# Altium footprint library Circuitos Integrados.PcbLib: 81 footprints (part 3 of 6)
Each footprint in its own frame and in the unit in brackets; x right, y up, seen from the top. Pads: shape width x height; smd on the part's side, far side on the other; paste and mask are expansions set on the pad; w line width, h text height; cw(c..) or ccw(c..) is an arc to the next point about the centre after c.
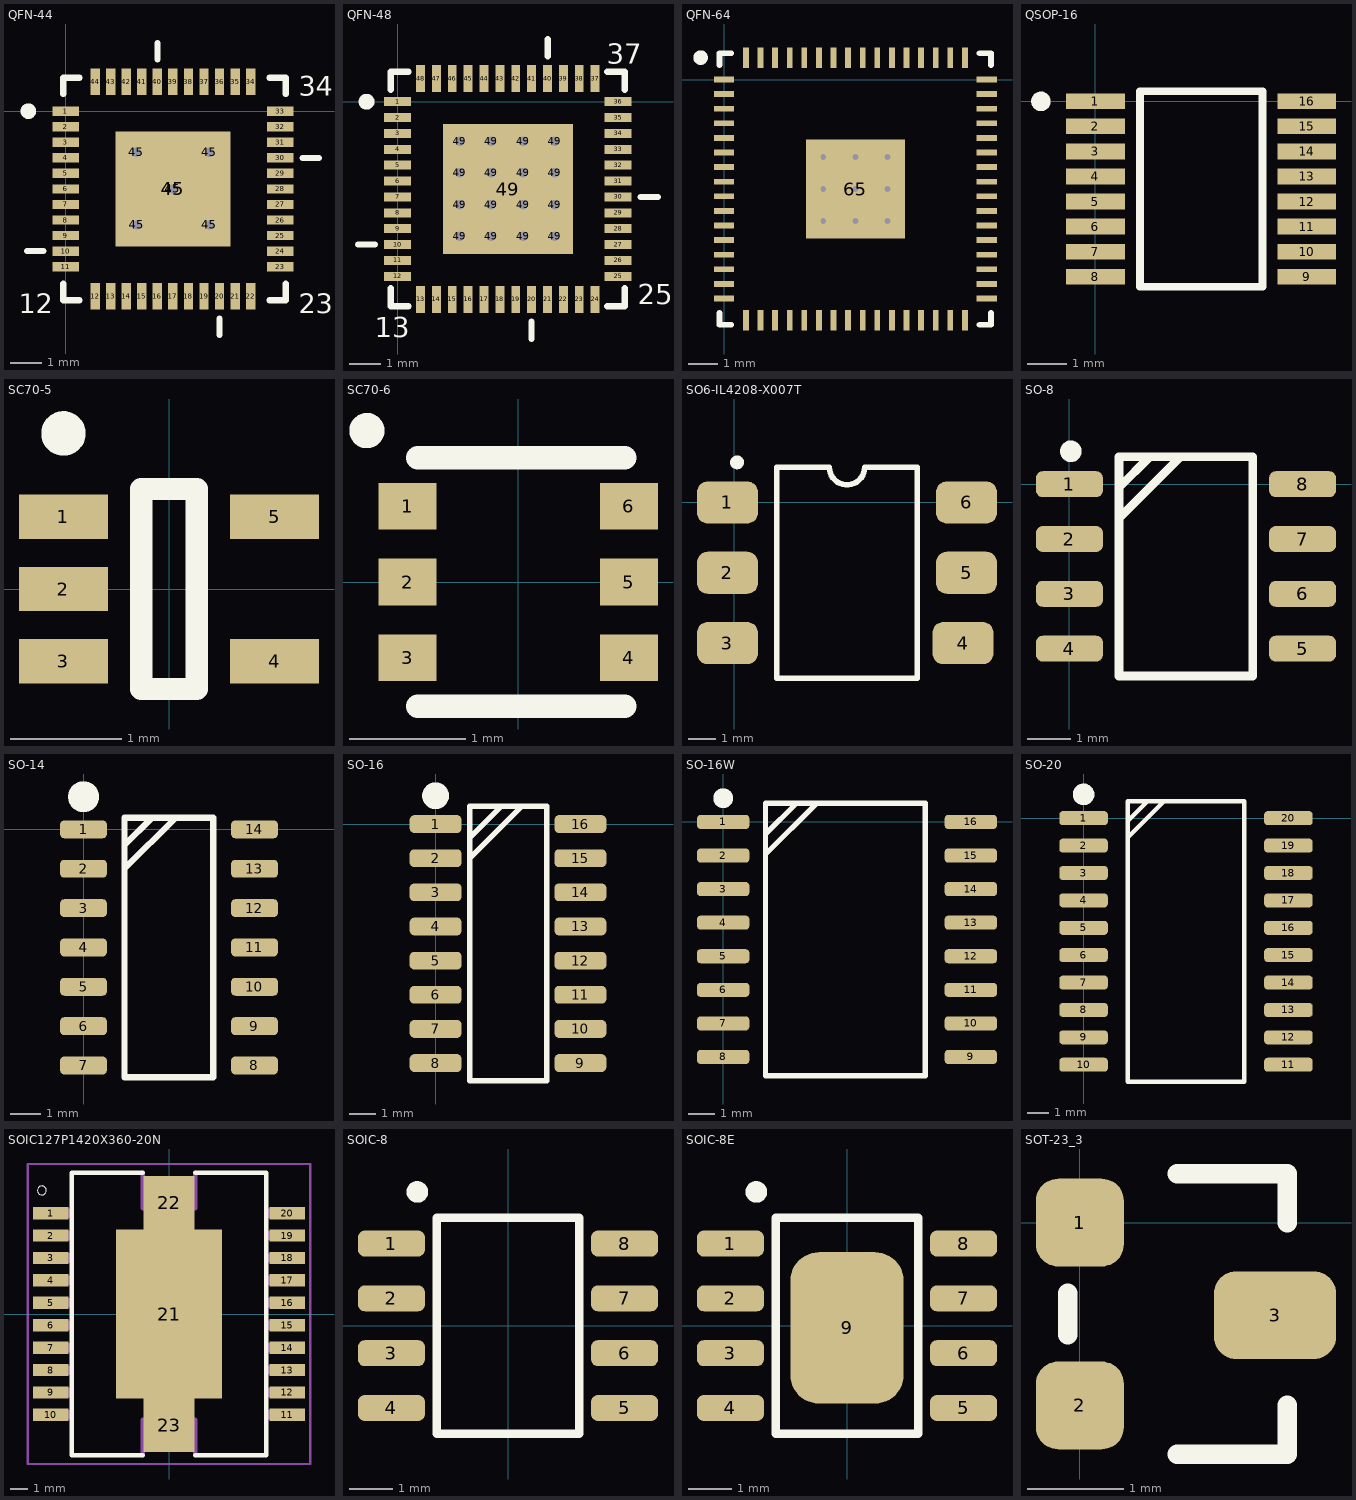
[diagram p2: the footprints below, top view; thin cyan lines are the x and y axes]

## QFN-44 [mm] "QFN, 44-Leads, Body 7,1x7,1mm (max), Pitch 0,50mm, IPC Low Density"
height 1
pads (50):
  rect 0.85x0.3 smd: 1(0,0) 2(0,-0.5) 3(0,-1) 4(0,-1.5) 5(0,-2) 6(0,-2.5) 7(0,-3) 8(0,-3.5) 9(0,-4) 10(0,-4.5) 11(0,-5) 23(6.9,-5) 24(6.9,-4.5) 25(6.9,-4) 26(6.9,-3.5) 27(6.9,-3) 28(6.9,-2.5) 29(6.9,-2) 30(6.9,-1.5) 31(6.9,-1) 32(6.9,-0.5) 33(6.9,0)
  rect 0.3x0.85 smd: 12(0.948,-5.952) 13(1.448,-5.952) 14(1.948,-5.952) 15(2.448,-5.952) 16(2.948,-5.952) 17(3.448,-5.952) 18(3.948,-5.952) 19(4.448,-5.952) 20(4.948,-5.952) 21(5.448,-5.952) 22(5.948,-5.952) 34(5.948,0.948) 35(5.448,0.948) 36(4.948,0.948) 37(4.448,0.948) 38(3.948,0.948) 39(3.448,0.948) 40(2.948,0.948) 41(2.448,0.948) 42(1.948,0.948) 43(1.448,0.948) 44(0.948,0.948)
  round 0.6 hole 0.3 mask+0.07: 45(2.273,-1.325) 45(2.286,-3.658) 45(3.448,-2.5) 45(4.623,-3.658) 45(4.623,-1.321)
  rect 3.7x3.7 smd paste-200 mask+0.07: 45(3.448,-2.5)
Top Overlay:
  circle w0.25: c-1.2,0 r0.125
  lines w0.2: -1.245,-4.496 -0.711,-4.496 ; 2.952,1.659 2.952,2.192 ; 4.943,-7.197 4.943,-6.664 ; 7.611,-1.504 8.145,-1.504
  lines w0.203: -0.077,-5.552 -0.077,-6.075 0.446,-6.075 ; -0.077,0.552 -0.077,1.075 0.446,1.075 ; 6.55,-6.075 7.074,-6.075 7.074,-5.552 ; 6.55,1.075 7.074,1.075 7.074,0.552
  text "34" at 7.5,0.5 h0.64
  text "23" at 7.5,-6.5 h0.64
  text "12" at -1.5,-6.5 h0.64
Top Paste:
  rectangle: 3.555,-3.674 4.555,-2.674
  region: 2.305,-2.674 2.305,-3.674 3.305,-3.674 3.305,-2.674
  rectangle: 3.555,-2.424 4.555,-1.424
  rectangle: 2.305,-2.424 3.305,-1.424
3D body "User Library-smd_qfn-44-2.STEP": height 0.9, standoff 0, extent -0.053,-6.003 6.949,0.999

## QFN-48 [mm] "QFN, 48-Leads, Body 7,2x7,2mm (max), Pitch 0,50mm, IPC Medium Density"
height 1
pads (65):
  rect 0.85x0.28 smd paste-0.02 mask+0.076: 1(0,0) 2(0,-0.5) 3(0,-1) 4(0,-1.5) 5(0,-2) 6(0,-2.5) 7(0,-3) 8(0,-3.5) 9(0,-4) 10(0,-4.5) 11(0,-5) 12(0,-5.5) 25(6.95,-5.5) 26(6.95,-5) 27(6.95,-4.5) 28(6.95,-4) 29(6.95,-3.5) 30(6.95,-3) 31(6.95,-2.5) 32(6.95,-2) 33(6.95,-1.5) 34(6.95,-1) 35(6.95,-0.5) 36(6.95,0)
  rect 0.28x0.85 smd paste-0.02 mask+0.076: 13(0.725,-6.225) 14(1.225,-6.225) 15(1.725,-6.225) 16(2.225,-6.225) 17(2.725,-6.225) 18(3.225,-6.225) 19(3.725,-6.225) 20(4.225,-6.225) 21(4.725,-6.225) 22(5.225,-6.225) 23(5.725,-6.225) 24(6.225,-6.225) 37(6.225,0.725) 38(5.725,0.725) 39(5.225,0.725) 40(4.725,0.725) 41(4.225,0.725) 42(3.725,0.725) 43(3.225,0.725) 44(2.725,0.725) 45(2.225,0.725) 46(1.725,0.725) 47(1.225,0.725) 48(0.725,0.725)
  round 0.5 hole 0.3: 49(1.956,-4.245) 49(1.956,-3.245) 49(1.956,-2.245) 49(1.956,-1.245) 49(2.956,-4.245) 49(2.956,-3.245) 49(2.956,-2.245) 49(2.956,-1.245) 49(3.956,-4.245) 49(3.956,-3.245) 49(3.956,-2.245) 49(3.956,-1.245) 49(4.956,-4.245) 49(4.956,-3.245) 49(4.956,-2.245) 49(4.956,-1.245)
  rect 4.1x4.1 smd paste-200 mask+0.076: 49(3.475,-2.75)
Top Overlay:
  circle w0.25: c-0.975,0 r0.125
  lines w0.2: -1.245,-4.496 -0.711,-4.496 ; 4.221,-7.47 4.221,-6.936 ; 4.729,1.436 4.729,1.97 ; 7.661,-3.004 8.195,-3.004
  lines w0.203: -0.213,-5.881 -0.213,-6.44 0.346,-6.44 ; -0.213,0.381 -0.213,0.94 0.346,0.94 ; 6.604,-6.44 7.163,-6.44 7.163,-5.881 ; 6.604,0.94 7.163,0.94 7.163,0.381
  text "13" at -0.711,-7.417 h0.64
  text "25" at 7.569,-6.375 h0.64
  text "37" at 6.596,1.203 h0.64
Top Paste:
  rectangle: 1.441,-4.775 2.591,-3.625
  rectangle: 2.889,-4.775 4.039,-3.625
  rectangle: 4.336,-4.775 5.486,-3.625
  rectangle: 1.441,-3.327 2.591,-2.177
  rectangle: 2.889,-3.327 4.039,-2.177
  rectangle: 4.336,-3.327 5.486,-2.177
  rectangle: 4.336,-1.88 5.486,-0.73
  rectangle: 2.889,-1.88 4.039,-0.73
  rectangle: 1.441,-1.88 2.591,-0.73
3D body "User Library-QFN48_7x7.STEP": height 0.78, standoff -0.02, extent -0.03,-6.248 6.99,0.772

## QFN-64 [mm]
height 1
pads (65):
  rect 0.7x0.2 smd: 1(0,0) 2(0,-0.5) 3(0,-1) 4(0,-1.5) 5(0,-2) 6(0,-2.5) 7(0,-3) 8(0,-3.5) 9(0,-4) 10(0,-4.5) 11(0,-5) 12(0,-5.5) 13(0,-6) 14(0,-6.5) 15(0,-7) 16(0,-7.5) 33(9,-7.5) 34(9,-7) 35(9,-6.5) 36(9,-6) 37(9,-5.5) 38(9,-5) 39(9,-4.5) 40(9,-4) 41(9,-3.5) 42(9,-3) 43(9,-2.5) 44(9,-2) 45(9,-1.5) 46(9,-1) 47(9,-0.5) 48(9,0)
  rect 0.2x0.7 smd: 17(0.75,-8.25) 18(1.25,-8.25) 19(1.75,-8.25) 20(2.25,-8.25) 21(2.75,-8.25) 22(3.25,-8.25) 23(3.75,-8.25) 24(4.25,-8.25) 25(4.75,-8.25) 26(5.25,-8.25) 27(5.75,-8.25) 28(6.25,-8.25) 29(6.75,-8.25) 30(7.25,-8.25) 31(7.75,-8.25) 32(8.25,-8.25) 49(8.25,0.75) 50(7.75,0.75) 51(7.25,0.75) 52(6.75,0.75) 53(6.25,0.75) 54(5.75,0.75) 55(5.25,0.75) 56(4.75,0.75) 57(4.25,0.75) 58(3.75,0.75) 59(3.25,0.75) 60(2.75,0.75) 61(2.25,0.75) 62(1.75,0.75) 63(1.25,0.75) 64(0.75,0.75)
  rect 3.4x3.4 smd: 65(4.5,-3.75)
via 5.6,-4.85 diameter 0.5 hole 0.2
via 4.5,-4.85 diameter 0.5 hole 0.2
via 3.4,-4.85 diameter 0.5 hole 0.2
via 5.6,-3.75 diameter 0.5 hole 0.2
via 4.5,-3.75 diameter 0.5 hole 0.2
via 3.4,-3.75 diameter 0.5 hole 0.2
via 5.6,-2.65 diameter 0.5 hole 0.2
via 4.5,-2.65 diameter 0.5 hole 0.2
via 3.4,-2.65 diameter 0.5 hole 0.2
Top Overlay:
  circle w0.25: c-0.8,0.75 r0.125
  lines w0.2: -0.15,-8 -0.15,-8.4 0.25,-8.4 ; -0.15,0.5 -0.15,0.9 0.25,0.9 ; 8.75,-8.4 9.15,-8.4 9.15,-8 ; 8.75,0.9 9.15,0.9 9.15,0.5
3D body "User Library-QFN64-2.STEP": height 0.9, standoff 0, extent -0.02,-8.27 9.02,0.77

## QSOP-16 [mm] "QSOP, 16-Leads, Body 5.0x4.0mm (max), Pitch 0.64mm, IPC Medium Density"
height 1.75
pads (16):
  rect 1.5x0.4 smd: 1(0,0) 2(0,-0.64) 3(0,-1.28) 4(0,-1.92) 5(0,-2.56) 6(0,-3.2) 7(0,-3.84) 8(0,-4.48) 9(5.4,-4.48) 10(5.4,-3.84) 11(5.4,-3.2) 12(5.4,-2.56) 13(5.4,-1.92) 14(5.4,-1.28) 15(5.4,-0.64) 16(5.4,0)
Top Overlay:
  circle w0.25: c-1.395,0 r0.125
  lines w0.2: 1.143,-4.74 4.267,-4.74 4.267,0.26 1.143,0.26 1.143,-4.74
3D body "User Library-MAX_QSOP16.STEP": height 1.81, standoff 0.04, extent -0.292,-4.725 5.728,0.255

## SC70-5 [mm] "SC-70, 5-Leads"
height 1.1
pads (5):
  rect 0.8x0.4 smd: 1(-0.95,0.65) 2(-0.95,0) 3(-0.95,-0.65) 4(0.95,-0.65) 5(0.95,0.65)
Top Overlay:
  circle w0.2: c-0.95,1.4 r0.1
  lines w0.2: -0.25,-0.9 0.25,-0.9 0.25,0.9 -0.25,0.9 -0.25,-0.9
3D body "sot353.STEP": height 1, standoff 0, extent -1.15,-1.05 1.15,1.05

## SC70-6 [mm] "SC70-6, 6 pins, Height = 1mm"
height 1
pads (6):
  rect 0.5x0.4 smd: 1(-0.95,0.65) 2(-0.95,0) 3(-0.95,-0.65) 4(0.95,-0.65) 5(0.95,0) 6(0.95,0.65)
Top Overlay:
  circle w0.15: c-1.3,1.3 r0.076
  lines w0.2: -0.864,-1.067 0.914,-1.067 ; -0.864,1.067 0.914,1.067
3D body "SC70-6.STEP": height 0.92, standoff -0.03, extent -1.05,-1 1.05,1

## SO6-IL4208-X007T [mm]
height 1.75
pads (6):
  rrect50% 2.2x1.52 smd: 1(-0.254,0) 2(-0.254,-2.54) 3(-0.254,-5.08) 4(8.254,-5.08) 5(8.382,-2.54) 6(8.382,0)
Top Overlay:
  circle w0.25: c0.092,1.449 r0.125
  lines w0.203: 1.524,-6.35 6.604,-6.35 6.604,1.27 4.699,1.27 cw(c4.064,1.27) 3.429,1.27 1.524,1.27 1.524,-6.35
3D body "User Library-N06C.step": height 3.82, standoff 0, extent -0.876,-6.1 9.004,1.02

## SO-8 [mm] "SOIC, 8-Leads, Pitch 1,27mm"
pads (8):
  rrect50% 1.55x0.6 smd: 1(0,0) 2(0,-1.27) 3(0,-2.54) 4(0,-3.81) 5(5.4,-3.81) 6(5.4,-2.54) 7(5.4,-1.27) 8(5.4,0)
Top Overlay:
  circle w0.25: c0.033,0.762 r0.125
  lines w0.203: 1.147,-0.791 2.573,0.635 ; 1.147,-0.076 1.859,0.635 ; 1.147,-4.445 1.147,0.635 4.246,0.635 4.246,-4.445 1.147,-4.445
3D body "SOIC-8.STEP": height 1.75, standoff 0, extent -0.3,-4.355 5.7,0.545

## SO-14 [mm] "SOIC, 14-Leads, Pitch 1,27mm"
pads (14):
  rrect50% 1.52x0.58 smd: 1(0,0) 2(0,-1.27) 3(0,-2.54) 4(0,-3.81) 5(0,-5.08) 6(0,-6.35) 7(0,-7.62) 8(5.52,-7.62) 9(5.52,-6.35) 10(5.52,-5.08) 11(5.52,-3.81) 12(5.52,-2.54) 13(5.52,-1.27) 14(5.52,0)
Top Overlay:
  circle w0.5: c0,1.054 r0.25
  lines w0.203: 1.321,-1.27 2.972,0.381 ; 1.321,-0.508 2.21,0.381 ; 1.321,-8.001 1.321,0.381 4.191,0.381 4.191,-8.001 1.321,-8.001
3D body "SOIC-14.STEP": height 1.75, standoff 0, extent -0.152,-8.085 5.648,0.465

## SO-16 [mil] "SOIC, 16-Leads, Pitch 1,27mm"
pads (16):
  rrect50% 76x26 smd: 1(0,0) 2(0,-50) 3(0,-100) 4(0,-150) 5(0,-200) 6(0,-250) 7(0,-300) 8(0,-350) 9(212,-350) 10(212,-300) 11(212,-250) 12(212,-200) 13(212,-150) 14(212,-100) 15(212,-50) 16(212,0)
Top Overlay:
  circle w19.68: c0,41.51 r9.84
  lines w8: 50,-50 125.83,25.83 ; 50,-20 95.83,25.83 ; 50,-375.83 50,25.83 163,25.83 163,-375.83 50,-375.83
3D body "SO-16.STEP": height 57, standoff 0, extent -13.88,-371.06 218.61,21.94

## SO-16W [mm] "SOIC, 16-Leads, 300mils Wide Body, Pitch 1,27mm, IPC Low Density"
height 2.65
pads (16):
  rrect50% 1.98x0.53 smd: 1(0,0) 2(0,-1.27) 3(0,-2.54) 4(0,-3.81) 5(0,-5.08) 6(0,-6.35) 7(0,-7.62) 8(0,-8.89) 9(9.37,-8.89) 10(9.37,-7.62) 11(9.37,-6.35) 12(9.37,-5.08) 13(9.37,-3.81) 14(9.37,-2.54) 15(9.37,-1.27) 16(9.37,0)
Top Overlay:
  circle w0.5: c0,0.9 r0.125
  lines w0.203: 1.6,-1.221 3.526,0.705 ; 1.6,-0.459 2.764,0.705 ; 1.6,-9.595 1.6,0.705 7.65,0.705 7.65,-9.595 1.6,-9.595
3D body "User Library-so16w.STEP": height 3.5, standoff 0, extent -0.451,-9.545 9.849,0.655

## SO-20 [mm] "SOIC, 20-Leads, Pitch 1,27mm"
height 2.65
pads (20):
  rrect50% 2.25x0.65 smd: 1(0,0) 2(0,-1.27) 3(0,-2.54) 4(0,-3.81) 5(0,-5.08) 6(0,-6.35) 7(0,-7.62) 8(0,-8.89) 9(0,-10.16) 10(0,-11.43) 11(9.5,-11.43) 12(9.5,-10.16) 13(9.5,-8.89) 14(9.5,-7.62) 15(9.5,-6.35) 16(9.5,-5.08) 17(9.5,-3.81) 18(9.5,-2.54) 19(9.5,-1.27) 20(9.5,0)
Top Overlay:
  circle w0.5: c0,1.105 r0.25
  lines w0.203: 2.054,-0.891 3.705,0.76 ; 2.054,-0.129 2.968,0.785 ; 2.054,-12.215 2.054,0.785 7.454,0.785 7.454,-12.215 2.054,-12.215
3D body "SO-20.STEP": height 2.65, standoff 0, extent -0.356,-12.09 9.944,0.71

## SOIC127P1420X360-20N [mm]
pads (23):
  rect 2x0.7 smd: 1(-6.7,5.715) 2(-6.7,4.445) 3(-6.7,3.175) 4(-6.7,1.905) 5(-6.7,0.635) 6(-6.7,-0.635) 7(-6.7,-1.905) 8(-6.7,-3.175) 9(-6.7,-4.445) 10(-6.7,-5.715) 11(6.7,-5.715) 12(6.7,-4.445) 13(6.7,-3.175) 14(6.7,-1.905) 15(6.7,-0.635) 16(6.7,0.635) 17(6.7,1.905) 18(6.7,3.175) 19(6.7,4.445) 20(6.7,5.715)
  rect 6x9.6 smd: 21(0,0)
  rect 2.9x3.05 smd: 22(0,6.3) 23(0,-6.3)
Top Overlay:
  circle w0: c-7.2,7 r0.254
  lines w0.254: -1.5,-8 -5.5,-8 -5.5,8 -1.5,8 ; 1.5,-8 5.5,-8 5.5,8 1.5,8
Top Paste:
  region: -1.903,3 1.9,3 1.9,-3.005 -1.903,-3.005
Mechanical 1:
  circle w0.127: c0,5 r0.671
  circle w0.127: c0,-5 r0.671
  region: -5.466,5.974 -5.466,5.46 -7.037,5.46 -7.037,5.974
  region: -5.47,4.708 -5.47,4.189 -7.038,4.189 -7.038,4.708
  region: -5.47,3.438 -5.47,2.917 -7.04,2.917 -7.04,3.438
  region: -5.464,2.162 -5.464,1.649 -7.038,1.649 -7.038,2.162
  region: -5.467,0.895 -5.467,0.375 -7.042,0.375 -7.042,0.895
  region: -5.464,-0.378 -5.464,-0.894 -7.04,-0.894 -7.04,-0.378
  region: -5.464,-1.648 -5.464,-2.165 -7.042,-2.165 -7.042,-1.648
  region: -5.461,-2.921 -5.461,-3.43 -7.037,-3.43 -7.037,-2.921
  region: -5.461,-4.191 -5.461,-4.704 -7.04,-4.704 -7.04,-4.191
  region: -5.461,-5.461 -5.461,-5.971 -7.038,-5.971 -7.038,-5.461
  region: 7.093,-5.468 7.093,-5.969 5.512,-5.969 5.512,-5.468
  region: 7.092,-4.197 7.092,-4.699 5.512,-4.699 5.512,-4.197
  region: 7.09,-2.924 7.09,-3.428 5.513,-3.428 5.513,-2.924
  region: 7.089,-1.654 7.089,-2.158 5.513,-2.158 5.513,-1.654
  region: 7.088,-0.382 7.088,-0.888 5.513,-0.888 5.513,-0.382
  region: 7.089,0.887 7.089,0.383 5.514,0.383 5.514,0.887
  region: 7.088,2.158 7.088,1.653 5.514,1.653 5.514,2.158
  region: 7.089,3.426 7.089,2.927 5.518,2.927 5.518,3.426
  region: 7.088,4.698 7.088,4.197 5.517,4.197 5.517,4.698
  region: 7.087,5.968 7.087,5.468 5.519,5.468 5.519,5.968
  lines w0.127: -8,-8.5 -8,8.5 8,8.5 8,-8.5 -8,-8.5
  lines w0.254: -1.5,-8 -1.5,-6 1.5,-6 1.5,-8 ; -1.5,8 -1.5,6 1.5,6 1.5,8
3D body "User Library-L298P.step": height 3.75, standoff 0, extent -7.25,-8 7.25,8

## SOIC-8 [mm] "SOIC, 8-Leads, Body 5,0x4,0mm (max), Pitch 1,27mm, IPC Medium Density"
height 1.75
pads (8):
  rrect50% 1.55x0.6 smd: 1(-2.7,1.905) 2(-2.7,0.635) 3(-2.7,-0.635) 4(-2.7,-1.905) 5(2.7,-1.905) 6(2.7,-0.635) 7(2.7,0.635) 8(2.7,1.905)
Top Overlay:
  circle w0.25: c-2.1,3.1 r0.125
  lines w0.2: -1.651,-2.5 1.651,-2.5 1.651,2.5 -1.651,2.5 -1.651,-2.5
3D body "SOIC-8.STEP": height 1.75, standoff 0, extent -3,-2.45 3,2.45

## SOIC-8E [mm] "SOIC, 8-Leads, Body 5,0x4,0mm (max), Pitch 1,27mm, IPC Medium Density"
height 1.75
pads (9):
  rrect50% 1.55x0.6 smd: 1(-2.7,1.905) 2(-2.7,0.635) 3(-2.7,-0.635) 4(-2.7,-1.905) 5(2.7,-1.905) 6(2.7,-0.635) 7(2.7,0.635) 8(2.7,1.905)
  rrect50% 2.62x3.51 smd: 9(0,-0.05)
Top Overlay:
  circle w0.25: c-2.1,3.1 r0.125
  lines w0.2: -1.651,-2.5 -1.651,2.5 1.651,2.5 1.651,-2.5 -1.651,-2.5
3D body "SOIC-8.STEP": height 1.75, standoff 0, extent -3,-2.45 3,2.45

## SOT-23_3 [mil] "SOT-23, 3-Pins"
pads (3):
  rrect50% 36x36 smd: 1(0,0) 2(0,-75)
  rrect50% 50x36 smd: 3(80,-38)
Top Overlay:
  lines w8: -5,-46 -5,-29 ; 40,-95 85,-95 85,-75 ; 40,20 85,20 85,0
3D body "SOT23-3.STEP": height 40.16, standoff 0, extent -6.42,-95.28 91.06,19.68